# Altium footprint library Nhat_Lib.PcbLib: 84 footprints (part 1 of 6)
Each footprint in its own frame and in the unit in brackets; x right, y up, seen from the top. Pads: shape width x height; smd on the part's side, far side on the other; paste and mask are expansions set on the pad; w line width, h text height; cw(c..) or ccw(c..) is an arc to the next point about the centre after c.
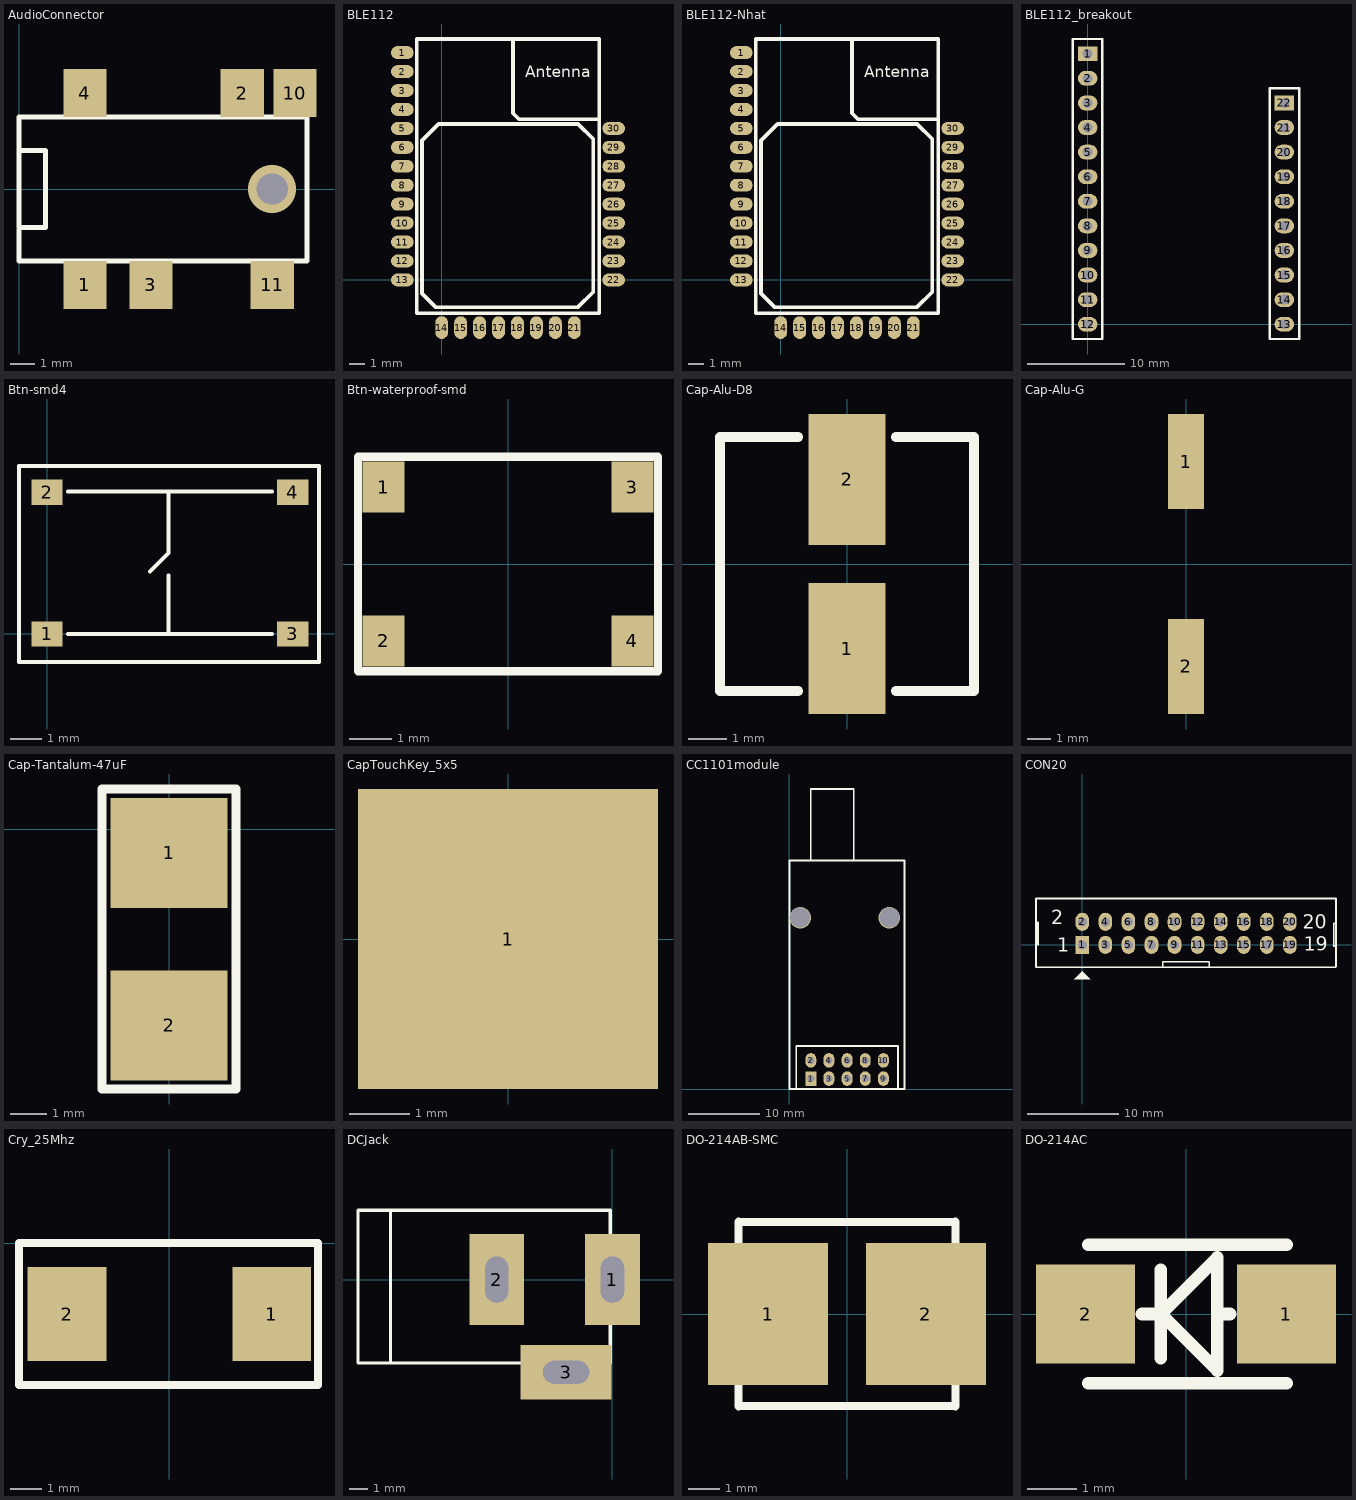
[diagram p0: the footprints below, top view; thin cyan lines are the x and y axes]

## AudioConnector [mm] "Stereo Jack 3.5mm"
pads (6):
  rect 1.8x2 smd: 1(2.75,-4) 2(9.3,4) 3(5.5,-4) 4(2.75,4) 10(11.5,4) 11(10.55,-4)
via 10.55,0 diameter 2 hole 1.3
Top Overlay:
  lines w0.203: 0,-1.7 0,-3 12,-3 12,3 0,3 0,1.6 ; 0,1.6 1.1,1.6 1.1,-1.6 0,-1.6 0,1.6

## BLE112 [mm]
pads (30):
  oval 1.5x0.85 smd: 1(-2.6,15) 2(-2.6,13.75) 3(-2.6,12.5) 4(-2.6,11.25) 5(-2.6,10) 6(-2.6,8.75) 7(-2.6,7.5) 8(-2.6,6.25) 9(-2.6,5) 10(-2.6,3.75) 11(-2.6,2.5) 12(-2.6,1.25) 13(-2.6,0) 22(11.35,0) 23(11.35,1.25) 24(11.35,2.5) 25(11.35,3.75) 26(11.35,5) 27(11.35,6.25) 28(11.35,7.5) 29(11.35,8.75) 30(11.35,10)
  oval 0.85x1.5 smd: 14(0,-3.15) 15(1.25,-3.15) 16(2.5,-3.15) 17(3.75,-3.15) 18(5,-3.15) 19(6.25,-3.15) 20(7.5,-3.15) 21(8.75,-3.15)
Top Overlay:
  lines w0.254: 4.7,15.9 4.7,11 5.1,10.6 10.4,10.6 ; -1.65,-2.2 10.4,-2.2 10.4,15.9 -1.65,15.9 -1.65,-2.2 ; -1.3,-0.9 -0.4,-1.8 9,-1.8 10,-0.8 10,9.3 9,10.3 -0.2,10.3 -1.3,9.2 -1.3,-0.9
  text "Antenna" at 5.5,13.1 h1.27
3D body: height 2.25, standoff 1, extent -1.3,11.8 1.8,15.2
3D body: height 2.3, standoff 0, extent -1.625,-2.2 10.425,15.9

## BLE112-Nhat [mm]
pads (30):
  oval 1.5x0.85 smd: 1(-2.6,15) 2(-2.6,13.75) 3(-2.6,12.5) 4(-2.6,11.25) 5(-2.6,10) 6(-2.6,8.75) 7(-2.6,7.5) 8(-2.6,6.25) 9(-2.6,5) 10(-2.6,3.75) 11(-2.6,2.5) 12(-2.6,1.25) 13(-2.6,0) 22(11.35,0) 23(11.35,1.25) 24(11.35,2.5) 25(11.35,3.75) 26(11.35,5) 27(11.35,6.25) 28(11.35,7.5) 29(11.35,8.75) 30(11.35,10)
  oval 0.85x1.5 smd: 14(0,-3.15) 15(1.25,-3.15) 16(2.5,-3.15) 17(3.75,-3.15) 18(5,-3.15) 19(6.25,-3.15) 20(7.5,-3.15) 21(8.75,-3.15)
Top Overlay:
  lines w0.254: 4.7,15.9 4.7,11 5.1,10.6 10.4,10.6 ; -1.65,-2.2 10.4,-2.2 10.4,15.9 -1.65,15.9 -1.65,-2.2 ; -1.3,-0.9 -0.4,-1.8 9,-1.8 10,-0.8 10,9.3 9,10.3 -0.2,10.3 -1.3,9.2 -1.3,-0.9
  text "Antenna" at 5.5,13.1 h1.27
3D body: height 2.3, standoff 1, extent -1.25,-1.75 10,10.25
3D body: height 1, standoff 0, extent -1.75,-2.25 10.5,15.75
3D body: height 2.25, standoff 1, extent -1.55,12.05 1.55,15.45

## BLE112_breakout [mil]
pads (22):
  rect 80x60 hole 40: 1(0,1100) 22(800,900)
  oval 80x60 hole 40: 2(0,1000) 3(0,900) 4(0,800) 5(0,700) 6(0,600) 7(0,500) 8(0,400) 9(0,300) 10(0,200) 11(0,100) 12(0,0) 13(800,0) 14(800,100) 15(800,200) 16(800,300) 17(800,400) 18(800,500) 19(800,600) 20(800,700) 21(800,800)
Top Overlay:
  lines w10: -60,-60 -60,1160 60,1160 60,-60 -60,-60 ; 740,-60 860,-60 860,960 740,960 740,-60
3D body: height 314.96, standoff 0, extent 750,900 850,950
3D body: height 314.96, standoff 0, extent 750,850 850,900
3D body: height 0, standoff -39.37, extent 790,890 810,910
3D body: height 314.96, standoff 0, extent 750,800 850,850
3D body: height 314.96, standoff 0, extent 750,750 850,800
3D body: height 0, standoff -39.37, extent 790,790 810,810
3D body: height 314.96, standoff 0, extent 750,700 850,750
3D body: height 314.96, standoff 0, extent 750,650 850,700
3D body: height 0, standoff -39.37, extent 790,690 810,710
3D body: height 314.96, standoff 0, extent 750,600 850,650
3D body: height 314.96, standoff 0, extent 750,550 850,600
3D body: height 0, standoff -39.37, extent 790,590 810,610
3D body: height 314.96, standoff 0, extent 750,500 850,550
3D body: height 314.96, standoff 0, extent 750,450 850,500
3D body: height 0, standoff -39.37, extent 790,490 810,510
3D body: height 314.96, standoff 0, extent 750,400 850,450
3D body: height 314.96, standoff 0, extent 750,350 850,400
3D body: height 0, standoff -39.37, extent 790,390 810,410
3D body: height 314.96, standoff 0, extent 750,300 850,350
3D body: height 314.96, standoff 0, extent 750,250 850,300
3D body: height 0, standoff -39.37, extent 790,290 810,310
3D body: height 314.96, standoff 0, extent 750,200 850,250
3D body: height 314.96, standoff 0, extent 750,150 850,200
3D body: height 0, standoff -39.37, extent 790,190 810,210
3D body: height 314.96, standoff 0, extent 750,100 850,150
3D body: height 314.96, standoff 0, extent 750,50 850,100
3D body: height 0, standoff -39.37, extent 790,90 810,110
3D body: height 314.96, standoff 0, extent 750,0 850,50
3D body: height 314.96, standoff 0, extent 750,-50 850,0
3D body: height 0, standoff -39.37, extent 790,-10 810,10
3D body: height 314.96, standoff 0, extent -50,0 50,50
3D body: height 314.96, standoff 0, extent -50,-50 50,0
3D body: height 0, standoff -39.37, extent -10,-10 10,10
3D body: height 314.96, standoff 0, extent -50,100 50,150
3D body: height 314.96, standoff 0, extent -50,50 50,100
3D body: height 0, standoff -39.37, extent -10,90 10,110
3D body: height 314.96, standoff 0, extent -50,200 50,250
3D body: height 314.96, standoff 0, extent -50,150 50,200
3D body: height 0, standoff -39.37, extent -10,190 10,210
3D body: height 314.96, standoff 0, extent -50,300 50,350
3D body: height 314.96, standoff 0, extent -50,250 50,300
3D body: height 0, standoff -39.37, extent -10,290 10,310
3D body: height 314.96, standoff 0, extent -50,400 50,450
3D body: height 314.96, standoff 0, extent -50,350 50,400
3D body: height 0, standoff -39.37, extent -10,390 10,410
3D body: height 314.96, standoff 0, extent -50,500 50,550
3D body: height 314.96, standoff 0, extent -50,450 50,500
3D body: height 0, standoff -39.37, extent -10,490 10,510
3D body: height 314.96, standoff 0, extent -50,600 50,650
3D body: height 314.96, standoff 0, extent -50,550 50,600
3D body: height 0, standoff -39.37, extent -10,590 10,610
3D body: height 314.96, standoff 0, extent -50,700 50,750
3D body: height 314.96, standoff 0, extent -50,650 50,700
3D body: height 0, standoff -39.37, extent -10,690 10,710
3D body: height 314.96, standoff 0, extent -50,800 50,850
3D body: height 314.96, standoff 0, extent -50,750 50,800
3D body: height 0, standoff -39.37, extent -10,790 10,810
3D body: height 314.96, standoff 0, extent -50,900 50,950
3D body: height 314.96, standoff 0, extent -50,850 50,900
3D body: height 0, standoff -39.37, extent -10,890 10,910
3D body: height 314.96, standoff 0, extent -50,1000 50,1050
3D body: height 314.96, standoff 0, extent -50,950 50,1000
3D body: height 0, standoff -39.37, extent -10,990 10,1010
3D body: height 314.96, standoff 0, extent -50,1100 50,1150
3D body: height 314.96, standoff 0, extent -50,1050 50,1100
3D body: height 0, standoff -39.37, extent -10,1090 10,1110
3D body: height 708.66, standoff 63.34, extent -80,-660 882.5,1440

## Btn-smd4 [mm]
pads (4):
  rect 1x0.8 smd: 1(0,0) 2(0,4.5) 3(7.8,0) 4(7.8,4.5)
Top Overlay:
  lines w0.127: 0.66,0 7.137,0 ; 0.66,4.521 7.137,4.521 ; 3.277,1.981 3.861,2.565 3.861,2.692 3.861,4.521 ; 3.861,0 3.861,1.854 ; -0.889,-0.889 8.636,-0.889 8.636,5.334 -0.889,5.334 -0.889,-0.889
3D body: height 5, standoff -0.05, extent -0.163,-0.739 7.987,5.261

## Btn-waterproof-smd [mm]
pads (4):
  rect 1x1.2 smd: 1(-2.95,1.825) 2(-2.95,-1.825) 3(2.95,1.825) 4(2.95,-1.825)
Top Overlay:
  lines w0.2: -3.556,-2.54 -3.556,2.54 3.556,2.54 3.556,-2.54 -3.556,-2.54
3D body: height 1.5, standoff 0, extent -3.2,-2.6 3.2,2.6

## Cap-Alu-D8 [mm] "Size D8, 100uF."
pads (2):
  rect 2x3.4 smd: 1(0,-2.2) 2(0,2.2)
Top Overlay:
  lines w0.254: -3.302,-3.302 -1.27,-3.302 ; -3.302,3.302 -1.27,3.302 ; -3.3,-3.3 -3.3,3.3 ; 1.27,-3.302 3.302,-3.302 ; 1.27,3.302 3.302,3.302 ; 3.3,-3.3 3.3,3.3
3D body: height 7.7, standoff 0, extent -3.3,-3.5 3.3,3.5

## Cap-Alu-G [mm] "330uF, size G."
pads (2):
  rect 1.5x4 smd: 1(0,4.3) 2(0,-4.3)

## Cap-Tantalum-47uF [mm]
pads (2):
  rect 3.2x3 smd: 1(0,-0.65) 2(0,-5.35)
Top Overlay:
  lines w0.254: -1.829,-7.087 -1.829,1.092 1.829,1.092 1.829,-7.087 -1.829,-7.087
3D body: height 2.7, standoff 0, extent -1.675,-6.098 1.675,0.002

## CapTouchKey_5x5 [mm]
pads (1):
  rect 5x5 smd: 1(0,0)

## CC1101module [mil]
pads (10):
  rect 60x80 hole 40: 1(118.11,57.48)
  oval 60x80 hole 40: 2(118.11,157.48) 3(218.11,57.48) 4(218.11,157.48) 5(318.11,57.48) 6(318.11,157.48) 7(418.11,57.48) 8(418.11,157.48) 9(518.11,57.48) 10(518.11,157.48)
via 59.06,944.88 diameter 118.11 hole 110.24
via 551.18,944.88 diameter 118.11 hole 110.24
Top Overlay:
  lines w10: 118.11,1259.84 118.11,1653.54 354.33,1653.54 354.33,1259.84 ; 0,0 634.84,0 634.84,1259.84 0,1259.84 0,0 ; 38.11,0 598.11,0 598.11,237.48 38.11,237.48 38.11,0

## CON20 [mm]
pads (20):
  rect 1.5x2 hole 1: 1(0,0)
  oval 1.5x2 hole 1: 2(0,2.54) 3(2.54,0) 4(2.54,2.54) 5(5.08,0) 6(5.08,2.54) 7(7.62,0) 8(7.62,2.54) 9(10.16,0) 10(10.16,2.54) 11(12.7,0) 12(12.7,2.54) 13(15.24,0) 14(15.24,2.54) 15(17.78,0) 16(17.78,2.54) 17(20.32,0) 18(20.32,2.54) 19(22.86,0) 20(22.86,2.54)
Top Overlay:
  region: 0,-2.921 -0.889,-3.81 0.889,-3.81
  lines w0.178: -5.1,-0.025 -5.075,0 -4.875,0 -4.875,2.475 -5.1,2.475 ; 8.875,-2.475 8.875,-1.875 13.975,-1.875 13.975,-2.425 14.025,-2.475 ; 27.94,-0.127 27.686,-0.127 27.686,2.398 27.94,2.398 ; 27.94,5.08 27.94,-2.413 27.878,-2.475 -5.1,-2.475 -5.1,5.1 27.94,5.1
  text "20" at 24.257,1.778 h1.52
  text "19" at 24.384,-0.635 h1.52
  text "2" at -3.429,2.286 h1.52
  text "1" at -2.775,-0.75 h1.52

## Cry_25Mhz [mm] "Crystal SMD 25Mhz"
pads (2):
  rect 2.5x3 smd: 1(3.25,-2.25) 2(-3.25,-2.25)
Top Overlay:
  lines w0.254: -4.775,-4.5 -4.775,0 4.724,0 4.724,-4.5 -4.775,-4.5

## DCJack [mm]
pads (3):
  rect 3x5 hole 1.27 slot 2.54 at 90 deg: 1(0,0) 2(-6.35,0)
  rect 5x3 hole 1.27 slot 2.54 at 0 deg: 3(-2.54,-5.08)
Top Overlay:
  lines w0.178: -12.192,-4.572 -12.192,3.81 ; -13.97,-4.572 -0.127,-4.572 -0.127,3.81 -13.97,3.81 -13.97,-4.572
3D body: height 11, standoff -4, extent -13.473,-5.228 1.027,4.572

## DO-214AB-SMC [mm] "Schottky diode 3A/40V"
pads (2):
  rect 3.8x4.5 smd: 1(-2.5,0) 2(2.5,0)
Top Overlay:
  lines w0.254: -3.43,-2.92 3.43,-2.92 ; -3.43,2.92 3.43,2.92 ; -3.429,-2.921 -3.429,2.921 ; 3.429,-2.921 3.429,2.921

## DO-214AC [mm]
pads (2):
  rect 2x2 smd: 1(2.03,0) 2(-2.03,0)
Top Overlay:
  lines w0.254: -1.978,-1.4 2.029,-1.4 2.032,-1.397 ; -1.978,1.4 2.029,1.4 2.032,1.397 ; -0.889,0 -0.508,0 ; -0.508,-0.889 -0.508,0 ; -0.508,0.889 -0.508,0 ; 0.635,0 0.889,0 ; -0.508,0 0.635,1.143 0.635,-1.143 -0.508,0
3D body: height 2.29, standoff 0.01, extent -2.743,-1.397 2.743,1.397